# Altium footprint library AOO.PcbLib: 131 footprints (part 6 of 9)
Each footprint in its own frame and in the unit in brackets; x right, y up, seen from the top. Pads: shape width x height; smd on the part's side, far side on the other; paste and mask are expansions set on the pad; w line width, h text height; cw(c..) or ccw(c..) is an arc to the next point about the centre after c.
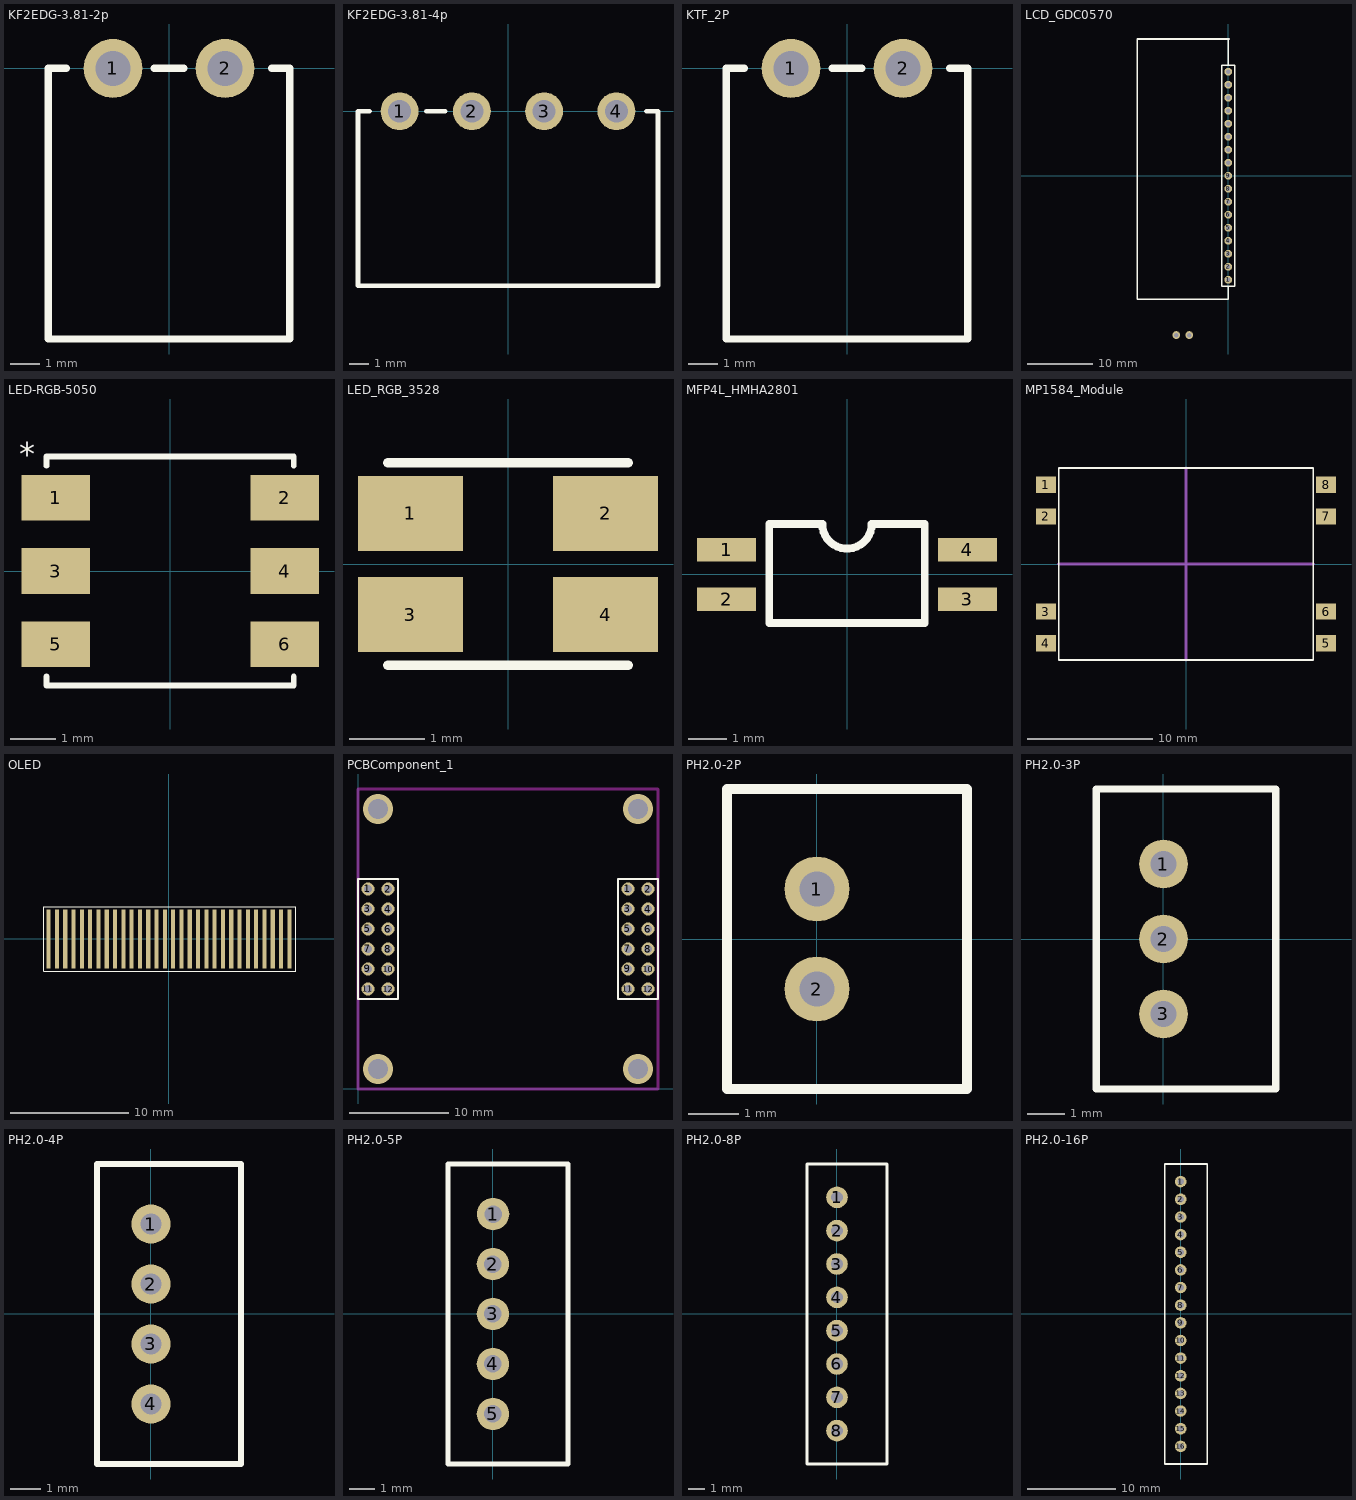
[diagram p5: the footprints below, top view; thin cyan lines are the x and y axes]

## KF2EDG-3.81-2p [mm] "KTF_2P"
pads (2):
  round 2 hole 1.2: 1(-1.905,0) 2(1.905,0)
Top Overlay:
  lines w0.254: -3.5,0 -4.1,0 -4.1,-9.2 4.1,-9.2 4.1,0 3.5,0 ; -0.5,0 0.5,0
3D body: height 4.6, standoff -4.6, extent -4.41,-11.2 4.01,-0.5

## KF2EDG-3.81-4p [mm] "KTF_2P"
pads (4):
  round 2 hole 1.2: 1(-5.715,0) 2(-1.905,0) 3(1.905,0) 4(5.715,0)
Top Overlay:
  lines w0.254: -7.31,0 -7.91,0 -7.91,-9.2 7.91,-9.2 7.91,0 7.31,0 ; -4.31,0 -3.31,0
3D body: height 7.02, standoff -3.68, extent -8.02,-9.2 8.02,0

## KTF_2P [mm] "KTF_2P"
pads (2):
  round 2 hole 1.2: 1(-1.905,0) 2(1.905,0)
Top Overlay:
  lines w0.254: -3.5,0 -4.1,0 -4.1,-9.2 4.1,-9.2 4.1,0 3.5,0 ; -0.5,0 0.5,0

## LCD_GDC0570 [mm]
pads (19):
  round 1.2 hole 0.7: 1(0,-16) 2(0,-14) 3(0,-12) 4(0,-10) 5(0,-8) 6(0,-6) 7(0,-4) 8(0,-2) 9(0,0) 10(0,2) 11(0,4) 12(0,6) 13(0,8) 14(0,10) 15(0,12) 16(0,14) 17(0,16) 18(-8,-24.5) 19(-6,-24.5)
Top Overlay:
  lines w0.2: -1,-17 -1,17 1,17 1,-17 -1,-17
  lines w0.254: 0,-17.025 0,-19 -14,-19 -14,21.025 0.15,21.025 ; 0,17 0,21
3D body: height 4.72, standoff -4.28, extent -14,-23.875 0.2,21.025

## LED-RGB-5050 [mm] "LED-RGB-5050"
pads (6):
  rect 1.5x1 smd: 1(-2.5,1.6) 2(2.5,1.6) 3(-2.5,0) 4(2.5,0) 5(-2.5,-1.6) 6(2.5,-1.6)
Top Overlay:
  lines w0.127: -2.7,-2.3 -2.7,-2.5 2.7,-2.5 2.7,-2.3 ; -2.7,2.3 -2.7,2.5 2.7,2.5 2.7,2.3
  text "*" at -3.3,2.3 h0.51
3D body: height 1.64, standoff 0.02, extent -2.7,-2.5 2.7,2.5

## LED_RGB_3528 [mm] "TBU_P500-G120"
pads (4):
  rect 1.4x1 smd: 1(-1.3,0.675) 2(1.3,0.675) 3(-1.3,-0.675) 4(1.3,-0.675)
Top Overlay:
  lines w0.127: -1.6,-1.35 1.6,-1.35 ; -1.6,1.35 1.6,1.35
3D body: height 1.13, standoff 0.02, extent -1.6,-1.35 1.6,1.35

## MFP4L_HMHA2801 [mm] "MFP4L_HMHA2801"
pads (4):
  rect 1.52x0.61 smd: 1(-3.1,0.635) 2(-3.1,-0.635) 3(3.1,-0.635) 4(3.1,0.635)
Top Overlay:
  lines w0.203: -2,-1.25 2,-1.25 2,1.3 0.635,1.3 cw(c0,1.3) -0.635,1.3 -2,1.3 -2,-1.25
3D body: height 2.31, standoff 0.02, extent -3.397,-1.25 3.398,1.25

## MP1584_Module [mm] "MP1584_Module"
pads (8):
  rect 1.6x1.3 smd: 1(-11.23,6.35) 2(-11.23,3.81) 3(-11.23,-3.81) 4(-11.23,-6.35) 5(11.23,-6.35) 6(11.23,-3.81) 7(11.23,3.81) 8(11.23,6.35)
Top Overlay:
  lines w0.127: -10.2,-7.7 10.2,-7.7 10.2,7.7 -10.2,7.7 -10.2,-7.7
Mechanical 2:
  lines w0.254: -10.2,0 10.2,0 ; 0,-7.7 0,7.7

## OLED [mm]
pads (30):
  rect 0.35x5 smd: 1(-10.15,0) 2(-9.45,0) 3(-8.75,0) 4(-8.05,0) 5(-7.35,0) 6(-6.65,0) 7(-5.95,0) 8(-5.25,0) 9(-4.55,0) 10(-3.85,0) 11(-3.15,0) 12(-2.45,0) 13(-1.75,0) 14(-1.05,0) 15(-0.35,0) 16(0.35,0) 17(1.05,0) 18(1.75,0) 19(2.45,0) 20(3.15,0) 21(3.85,0) 22(4.55,0) 23(5.25,0) 24(5.95,0) 25(6.65,0) 26(7.35,0) 27(8.05,0) 28(8.75,0) 29(9.45,0) 30(10.15,0)
Top Overlay:
  lines w0.1: -10.575,-2.7 10.675,-2.7 10.675,2.7 -10.575,2.7 -10.575,-2.7

## PCBComponent_1 [mm]
pads (24):
  round 1.3 hole 0.8: 1(1,20) 1(27,20) 2(3,20) 2(29,20) 3(1,18) 3(27,18) 4(3,18) 4(29,18) 5(1,16) 5(27,16) 6(3,16) 6(29,16) 7(1,14) 7(27,14) 8(3,14) 8(29,14) 9(1,12) 9(27,12) 10(3,12) 10(29,12) 11(1,10) 11(27,10) 12(3,10) 12(29,10)
via 28,2 diameter 3 hole 2
via 2,2 diameter 3 hole 2
via 2,28 diameter 3 hole 2
via 28,28 diameter 3 hole 2
Top Overlay:
  lines w0.2: 0,9 0,21 4,21 4,9 0,9 ; 26,9 26,21 30,21 30,9 26,9
Keep-Out Layer:
  lines w0.254: 0,0 30,0 30,30 0,30 0,0
3D body: height 6.02, standoff -2.78, extent 0,9 4,21
3D body: height 6.02, standoff -2.78, extent 26,9 30,21

## PH2.0-2P [mm]
pads (2):
  round 1.3 hole 0.7: 1(0,1) 2(0,-1)
Top Overlay:
  lines w0.2: -1.8,-3 -1.8,3 3,3 3,-3 -1.8,-3
3D body: height 6.22, standoff -3.38, extent -1.8,-3 3,3

## PH2.0-3P [mm]
pads (3):
  round 1.3 hole 0.7: 1(0,2) 2(0,0) 3(0,-2)
Top Overlay:
  lines w0.2: -1.8,-4 3,-4 3,4 -1.8,4 -1.8,-4
3D body: height 6.22, standoff -3.38, extent -1.8,-4 3,4

## PH2.0-4P [mm]
pads (4):
  round 1.3 hole 0.7: 1(0,3) 2(0,1) 3(0,-1) 4(0,-3)
Top Overlay:
  lines w0.2: -1.8,-5 -1.8,5 3,5 3,-5 -1.8,-5
3D body: height 6.22, standoff -3.38, extent -1.8,-5 3,5

## PH2.0-5P [mm]
pads (5):
  round 1.3 hole 0.7: 1(0,4) 2(0,2) 3(0,0) 4(0,-2) 5(0,-4)
Top Overlay:
  lines w0.2: -1.8,-6 -1.8,6 3,6 3,-6 -1.8,-6
3D body: height 6.22, standoff -3.38, extent -1.8,-6 3,6

## PH2.0-8P [mm]
pads (8):
  round 1.3 hole 0.7: 1(0,7) 2(0,5) 3(0,3) 4(0,1) 5(0,-1) 6(0,-3) 7(0,-5) 8(0,-7)
Top Overlay:
  lines w0.2: -1.8,-9 -1.8,9 3,9 3,-9 -1.8,-9
3D body: height 6.22, standoff -3.38, extent -1.8,-9 3,9

## PH2.0-16P [mm]
pads (16):
  round 1.3 hole 0.7: 1(0,15) 2(0,13) 3(0,11) 4(0,9) 5(0,7) 6(0,5) 7(0,3) 8(0,1) 9(0,-1) 10(0,-3) 11(0,-5) 12(0,-7) 13(0,-9) 14(0,-11) 15(0,-13) 16(0,-15)
Top Overlay:
  lines w0.2: -1.8,-17 -1.8,17 3,17 3,-17 -1.8,-17
3D body: height 6.22, standoff -3.38, extent -1.8,-17 3,17